# Altium footprint library Pin Header WR-PHD_2.54mm.PcbLib: 138 footprints (part 3 of 9)
Each footprint in its own frame and in the unit in brackets; x right, y up, seen from the top. Pads: shape width x height; smd on the part's side, far side on the other; paste and mask are expansions set on the pad; w line width, h text height; cw(c..) or ccw(c..) is an arc to the next point about the centre after c.
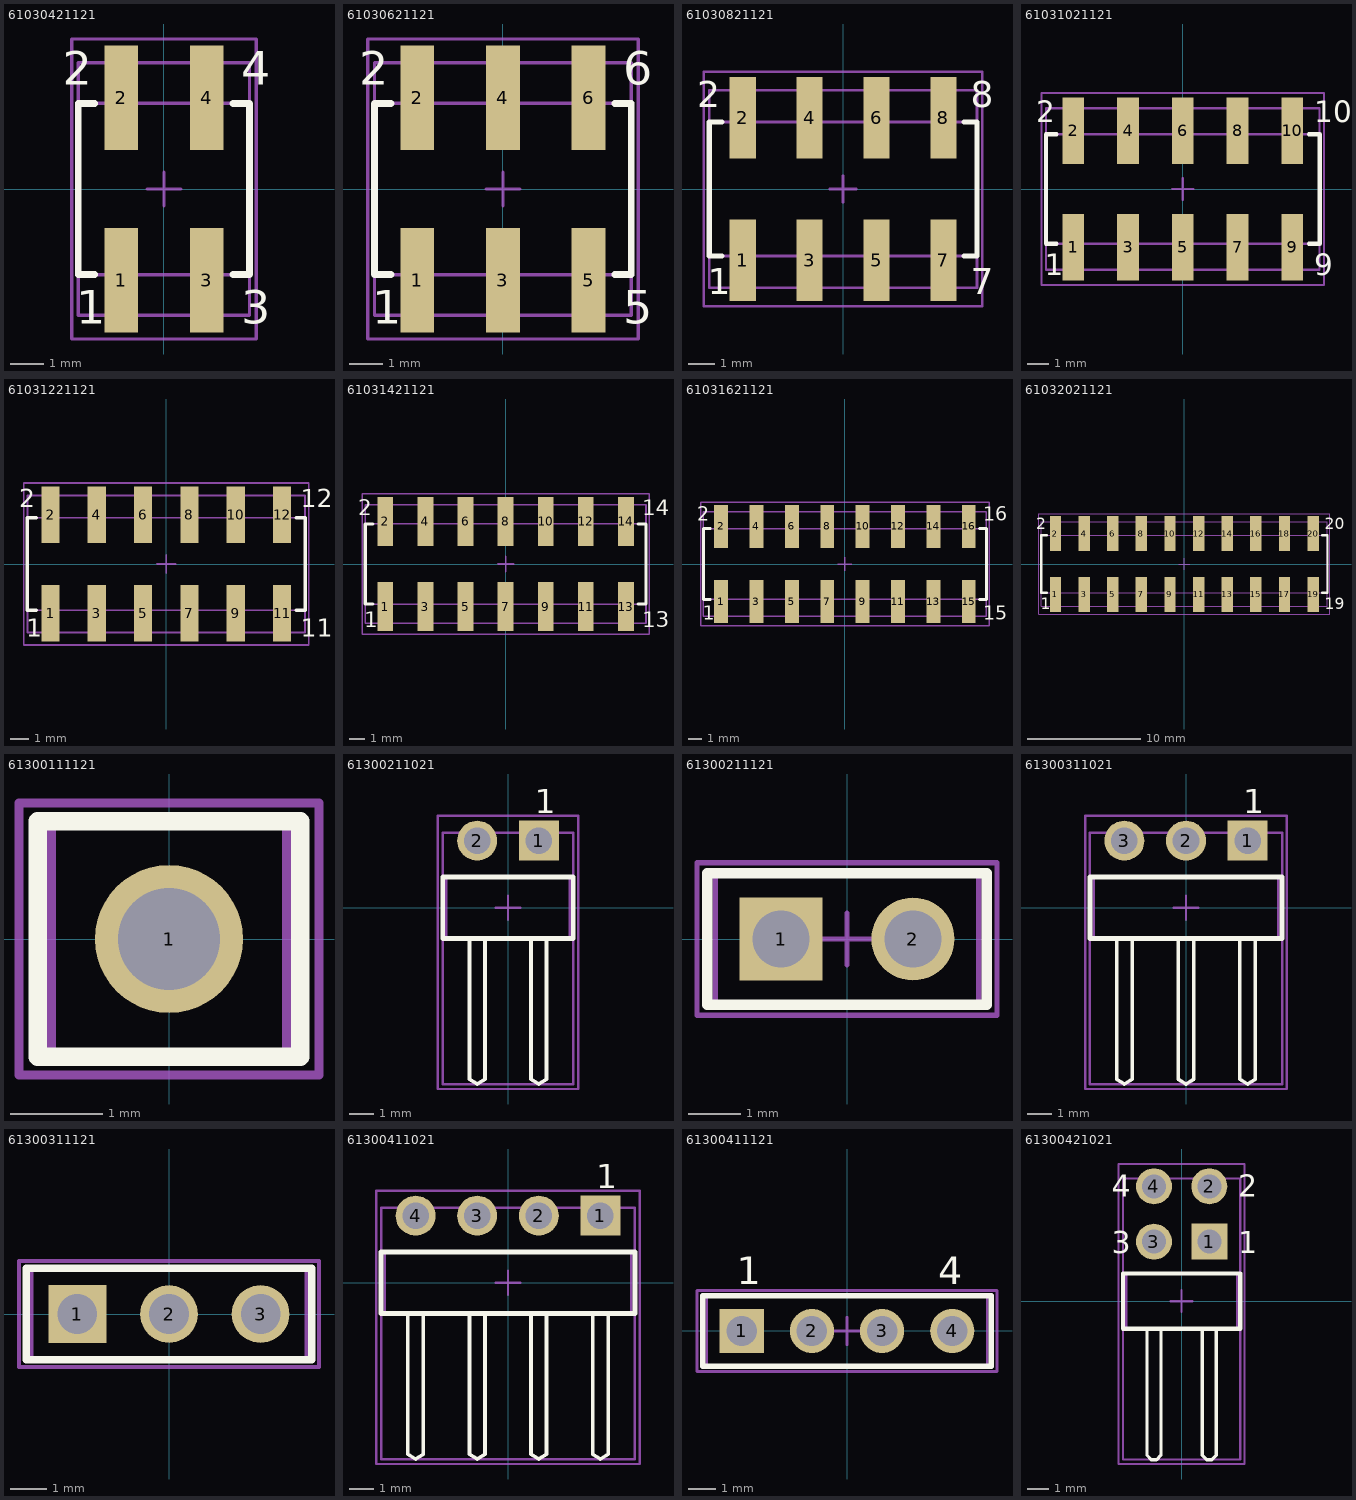
[diagram p2: the footprints below, top view; thin cyan lines are the x and y axes]

## 61030421121 [mm] "Pin Header, pitch 2.54 mm, SMD, Vertical, dual row, 4p"
height 9.6
pads (4):
  rect 1x3.1 smd: 1(-1.27,-2.7) 2(-1.27,2.7) 3(1.27,-2.7) 4(1.27,2.7)
Top Overlay:
  lines w0.2: -2.05,-2.54 -2.54,-2.54 -2.54,2.54 -2.05,2.54 ; 2.05,-2.54 2.54,-2.54 2.54,2.54 2.05,2.54
  text "2" at -3,3.1 h1
  text "4" at 2.3,3.1 h1
  text "3" at 2.3,-4 h1
  text "1" at -2.6,-4 h1
Mechanical 11:
  lines w0.1: -2.54,-2.54 -2.54,2.54 2.54,2.54 2.54,-2.54 -2.54,-2.54
Mechanical 13:
  lines w0.1: -2.54,-3.75 2.54,-3.75 2.54,3.75 -2.54,3.75 -2.54,-3.75
Mechanical 15:
  lines w0.1: -0.5,0 0.5,0 ; 0,-0.5 0,0.5 ; -2.74,-4.45 2.74,-4.45 2.74,4.45 -2.74,4.45 -2.74,-4.45
3D body "61030421121.stp": height 9.62, standoff 0.02, extent -2.54,-3.75 2.54,3.75

## 61030621121 [mm] "Pin Header, pitch 2.54 mm, SMD, Vertical, dual row, 6p"
height 9.6
pads (6):
  rect 1x3.1 smd: 1(-2.54,-2.7) 2(-2.54,2.7) 3(0,-2.7) 4(0,2.7) 5(2.54,-2.7) 6(2.54,2.7)
Top Overlay:
  lines w0.2: -3.32,-2.54 -3.81,-2.54 -3.81,2.54 -3.32,2.54 ; 3.32,-2.54 3.81,-2.54 3.81,2.54 3.32,2.54
  text "6" at 3.57,3.1 h1
  text "5" at 3.57,-4 h1
  text "1" at -3.87,-4 h1
  text "2" at -4.27,3.1 h1
Mechanical 11:
  lines w0.1: -3.81,-2.54 3.81,-2.54 3.81,2.54 -3.81,2.54 -3.81,-2.54
Mechanical 13:
  lines w0.1: -3.81,-3.75 -3.81,3.75 3.81,3.75 3.81,-3.75 -3.81,-3.75
Mechanical 15:
  lines w0.1: -0.5,0 0.5,0 ; 0,-0.5 0,0.5 ; -4.01,-4.45 -4.01,4.45 4.01,4.45 4.01,-4.45 -4.01,-4.45
3D body "61030621121.stp": height 9.62, standoff 0.02, extent -3.81,-3.75 3.81,3.75

## 61030821121 [mm] "Pin Header, pitch 2.54 mm, SMD, Vertical, dual row, 8p"
height 9.6
pads (8):
  rect 1x3.1 smd: 1(-3.81,-2.7) 2(-3.81,2.7) 3(-1.27,-2.7) 4(-1.27,2.7) 5(1.27,-2.7) 6(1.27,2.7) 7(3.81,-2.7) 8(3.81,2.7)
Top Overlay:
  lines w0.2: -4.59,-2.54 -5.08,-2.54 -5.08,2.54 -4.59,2.54 ; 4.59,-2.54 5.08,-2.54 5.08,2.54 4.59,2.54
  text "8" at 4.84,3.1 h1
  text "7" at 4.84,-4 h1
  text "1" at -5.14,-4 h1
  text "2" at -5.54,3.1 h1
Mechanical 11:
  lines w0.1: -5.08,-2.54 5.08,-2.54 5.08,2.54 -5.08,2.54 -5.08,-2.54
Mechanical 13:
  lines w0.1: -5.08,-3.75 -5.08,3.75 5.08,3.75 5.08,-3.75 -5.08,-3.75
Mechanical 15:
  lines w0.1: -0.5,0 0.5,0 ; 0,-0.5 0,0.5 ; -5.28,-4.45 -5.28,4.45 5.28,4.45 5.28,-4.45 -5.28,-4.45
3D body "61030821121.stp": height 9.62, standoff 0.02, extent -5.08,-3.75 5.08,3.75

## 61031021121 [mm] "Pin Header, pitch 2.54 mm, SMD, Vertical, dual row, 10p"
height 9.6
pads (10):
  rect 1x3.1 smd: 1(-5.08,-2.7) 2(-5.08,2.7) 3(-2.54,-2.7) 4(-2.54,2.7) 5(0,-2.7) 6(0,2.7) 7(2.54,-2.7) 8(2.54,2.7) 9(5.08,-2.7) 10(5.08,2.7)
Top Overlay:
  lines w0.2: -5.86,-2.54 -6.35,-2.54 -6.35,2.54 -5.86,2.54 ; 5.86,-2.54 6.35,-2.54 6.35,2.54 5.86,2.54
  text "10" at 6.11,3.1 h1
  text "9" at 6.11,-4 h1
  text "1" at -6.41,-4 h1
  text "2" at -6.81,3.1 h1
Mechanical 11:
  lines w0.1: -6.35,-2.54 6.35,-2.54 6.35,2.54 -6.35,2.54 -6.35,-2.54
Mechanical 13:
  lines w0.1: -6.35,-3.75 -6.35,3.75 6.35,3.75 6.35,-3.75 -6.35,-3.75
Mechanical 15:
  lines w0.1: -0.5,0 0.5,0 ; 0,-0.5 0,0.5 ; -6.55,-4.45 -6.55,4.45 6.55,4.45 6.55,-4.45 -6.55,-4.45
3D body "61031021121.stp": height 9.62, standoff 0.02, extent -6.35,-3.75 6.35,3.75

## 61031221121 [mm] "Pin Header, pitch 2.54 mm, SMD, Vertical, dual row, 12p"
height 9.6
pads (12):
  rect 1x3.1 smd: 1(-6.35,-2.7) 2(-6.35,2.7) 3(-3.81,-2.7) 4(-3.81,2.7) 5(-1.27,-2.7) 6(-1.27,2.7) 7(1.27,-2.7) 8(1.27,2.7) 9(3.81,-2.7) 10(3.81,2.7) 11(6.35,-2.7) 12(6.35,2.7)
Top Overlay:
  lines w0.2: -7.13,-2.54 -7.62,-2.54 -7.62,2.54 -7.13,2.54 ; 7.13,-2.54 7.62,-2.54 7.62,2.54 7.13,2.54
  text "12" at 7.38,3.1 h1
  text "11" at 7.38,-4 h1
  text "1" at -7.68,-4 h1
  text "2" at -8.08,3.1 h1
Mechanical 11:
  lines w0.1: -7.62,-2.54 7.62,-2.54 7.62,2.54 -7.62,2.54 -7.62,-2.54
Mechanical 13:
  lines w0.1: -7.62,-3.75 -7.62,3.75 7.62,3.75 7.62,-3.75 -7.62,-3.75
Mechanical 15:
  lines w0.1: -0.5,0 0.5,0 ; 0,-0.5 0,0.5 ; -7.82,-4.45 -7.82,4.45 7.82,4.45 7.82,-4.45 -7.82,-4.45
3D body "61031221121.stp": height 9.62, standoff 0.02, extent -7.62,-3.75 7.62,3.75

## 61031421121 [mm] "Pin Header, pitch 2.54 mm, SMD, Vertical, dual row, 14p"
height 9.6
pads (14):
  rect 1x3.1 smd: 1(-7.62,-2.7) 2(-7.62,2.7) 3(-5.08,-2.7) 4(-5.08,2.7) 5(-2.54,-2.7) 6(-2.54,2.7) 7(0,-2.7) 8(0,2.7) 9(2.54,-2.7) 10(2.54,2.7) 11(5.08,-2.7) 12(5.08,2.7) 13(7.62,-2.7) 14(7.62,2.7)
Top Overlay:
  lines w0.2: -8.4,-2.54 -8.89,-2.54 -8.89,2.54 -8.4,2.54 ; 8.4,-2.54 8.89,-2.54 8.89,2.54 8.4,2.54
  text "14" at 8.65,3.1 h1
  text "13" at 8.65,-4 h1
  text "1" at -8.95,-4 h1
  text "2" at -9.35,3.1 h1
Mechanical 11:
  lines w0.1: -8.89,-2.54 8.89,-2.54 8.89,2.54 -8.89,2.54 -8.89,-2.54
Mechanical 13:
  lines w0.1: -8.89,-3.75 -8.89,3.75 8.89,3.75 8.89,-3.75 -8.89,-3.75
Mechanical 15:
  lines w0.1: -0.5,0 0.5,0 ; 0,-0.5 0,0.5 ; -9.09,-4.45 -9.09,4.45 9.09,4.45 9.09,-4.45 -9.09,-4.45
3D body "61031421121.stp": height 9.62, standoff 0.02, extent -8.89,-3.75 8.89,3.75

## 61031621121 [mm] "Pin Header, pitch 2.54 mm, SMD, Vertical, dual row, 16p"
height 9.6
pads (16):
  rect 1x3.1 smd: 1(-8.89,-2.7) 2(-8.89,2.7) 3(-6.35,-2.7) 4(-6.35,2.7) 5(-3.81,-2.7) 6(-3.81,2.7) 7(-1.27,-2.7) 8(-1.27,2.7) 9(1.27,-2.7) 10(1.27,2.7) 11(3.81,-2.7) 12(3.81,2.7) 13(6.35,-2.7) 14(6.35,2.7) 15(8.89,-2.7) 16(8.89,2.7)
Top Overlay:
  lines w0.2: -9.67,-2.54 -10.16,-2.54 -10.16,2.54 -9.67,2.54 ; 9.67,-2.54 10.16,-2.54 10.16,2.54 9.67,2.54
  text "16" at 9.92,3.1 h1
  text "15" at 9.92,-4 h1
  text "1" at -10.22,-4 h1
  text "2" at -10.62,3.1 h1
Mechanical 11:
  lines w0.1: -10.16,-2.54 10.16,-2.54 10.16,2.54 -10.16,2.54 -10.16,-2.54
Mechanical 13:
  lines w0.1: -10.16,-3.75 -10.16,3.75 10.16,3.75 10.16,-3.75 -10.16,-3.75
Mechanical 15:
  lines w0.1: -0.5,0 0.5,0 ; 0,-0.5 0,0.5 ; -10.36,-4.45 -10.36,4.45 10.36,4.45 10.36,-4.45 -10.36,-4.45
3D body "61031621121.stp": height 9.62, standoff 0.02, extent -10.16,-3.75 10.16,3.75

## 61032021121 [mm] "Pin Header, pitch 2.54 mm, SMD, Vertical, dual row, 20p"
height 9.6
pads (20):
  rect 1x3.1 smd: 1(-11.43,-2.7) 2(-11.43,2.7) 3(-8.89,-2.7) 4(-8.89,2.7) 5(-6.35,-2.7) 6(-6.35,2.7) 7(-3.81,-2.7) 8(-3.81,2.7) 9(-1.27,-2.7) 10(-1.27,2.7) 11(1.27,-2.7) 12(1.27,2.7) 13(3.81,-2.7) 14(3.81,2.7) 15(6.35,-2.7) 16(6.35,2.7) 17(8.89,-2.7) 18(8.89,2.7) 19(11.43,-2.7) 20(11.43,2.7)
Top Overlay:
  lines w0.2: -12.21,-2.54 -12.7,-2.54 -12.7,2.54 -12.21,2.54 ; 12.21,-2.54 12.7,-2.54 12.7,2.54 12.21,2.54
  text "20" at 12.46,3.1 h1
  text "19" at 12.46,-4 h1
  text "1" at -12.76,-4 h1
  text "2" at -13.16,3.1 h1
Mechanical 11:
  lines w0.1: -12.7,-2.54 12.7,-2.54 12.7,2.54 -12.7,2.54 -12.7,-2.54
Mechanical 13:
  lines w0.1: -12.7,-3.75 -12.7,3.75 12.7,3.75 12.7,-3.75 -12.7,-3.75
Mechanical 15:
  lines w0.1: -0.5,0 0.5,0 ; 0,-0.5 0,0.5 ; -12.9,-4.45 -12.9,4.45 12.9,4.45 12.9,-4.45 -12.9,-4.45
3D body "61032021121.stp": height 9.62, standoff 0.02, extent -12.7,-3.75 12.7,3.75

## 61300111121 [mm] "Pin Header, pitch 2.54 mm, THT, Vertical, single row, 1p"
height 8.54
pads (1):
  round 1.6 hole 1.1: 1(0,0)
Top Overlay:
  lines w0.2: -1.42,-1.27 1.42,-1.27 1.42,1.27 -1.42,1.27 -1.42,-1.27
Mechanical 11:
  lines w0.1: -1.27,-1.27 1.27,-1.27 1.27,1.27 -1.27,1.27 -1.27,-1.27
Mechanical 13:
  lines w0.1: -1.42,-1.27 1.42,-1.27 1.42,1.27 -1.42,1.27 -1.42,-1.27
Mechanical 15:
  lines w0.1: -0.5,0 0.5,0 ; 0,-0.5 0,0.5 ; -1.62,-1.47 1.62,-1.47 1.62,1.47 -1.62,1.47 -1.62,-1.47
3D body "61300111121.stp": height 8.57, standoff -2.97, extent -1.27,-1.27 1.27,1.27

## 61300211021 [mm] "Pin Header, pitch 2.54 mm, THT, Angled, single row, 2p"
height 2.54
pads (2):
  rect 1.65x1.65 hole 1.1: 1(1.27,2.77)
  round 1.65 hole 1.1: 2(-1.27,2.77)
Top Overlay:
  lines w0.15: -1.59,-1.27 -1.59,-7.07 -1.27,-7.27 -0.95,-7.07 -0.95,-1.27 ; 0.95,-1.27 0.95,-7.07 1.27,-7.27 1.59,-7.07 1.59,-1.27
  lines w0.2: -2.69,-1.27 -2.69,1.27 2.69,1.27 2.69,-1.27 -2.69,-1.27
  text "1" at 1.1,3.9 h1
Mechanical 11:
  lines w0.1: -2.54,-1.27 -2.54,1.27 2.54,1.27 2.54,-1.27 -2.54,-1.27
Mechanical 13:
  lines w0.1: -2.69,-7.27 2.69,-7.27 2.69,3.09 -2.69,3.09 -2.69,-7.27
Mechanical 15:
  lines w0.1: -0.5,0 0.5,0 ; 0,-0.5 0,0.5 ; -2.89,-7.47 2.89,-7.47 2.89,3.795 -2.89,3.795 -2.89,-7.47
3D body "61300211021.stp": height 2.62, standoff -2.92, extent -2.54,-7.27 2.54,3.09

## 61300211121 [mm] "Pin Header, pitch 2.54 mm, THT, Vertical, single row, 2p"
height 8.54
pads (2):
  rect 1.6x1.6 hole 1.1: 1(-1.27,0)
  round 1.6 hole 1.1: 2(1.27,0)
Top Overlay:
  lines w0.2: -2.69,-1.27 -2.69,1.27 2.69,1.27 2.69,-1.27 -2.69,-1.27
Mechanical 11:
  lines w0.1: -2.54,-1.27 -2.54,1.27 2.54,1.27 2.54,-1.27 -2.54,-1.27
Mechanical 13:
  lines w0.1: -2.69,-1.27 -2.69,1.27 2.69,1.27 2.69,-1.27 -2.69,-1.27
Mechanical 15:
  lines w0.1: -0.5,0 0.5,0 ; 0,-0.5 0,0.5 ; -2.89,-1.47 -2.89,1.47 2.89,1.47 2.89,-1.47 -2.89,-1.47
3D body "61300211121.stp": height 8.57, standoff -2.97, extent -2.54,-1.27 2.54,1.27

## 61300311021 [mm] "Pin Header, pitch 2.54 mm, THT, Angled, single row, 3p"
height 2.54
pads (3):
  rect 1.65x1.65 hole 1.1: 1(2.54,2.77)
  round 1.65 hole 1.1: 2(0,2.77) 3(-2.54,2.77)
Top Overlay:
  lines w0.15: -2.86,-1.27 -2.86,-7.07 -2.54,-7.27 -2.22,-7.07 -2.22,-1.27 ; -0.32,-1.27 -0.32,-7.07 0,-7.27 0.32,-7.07 0.32,-1.27 ; 2.22,-1.27 2.22,-7.07 2.54,-7.27 2.86,-7.07 2.86,-1.27
  lines w0.2: -3.96,-1.27 -3.96,1.27 3.96,1.27 3.96,-1.27 -3.96,-1.27
  text "1" at 2.37,3.9 h1
Mechanical 11:
  lines w0.1: -3.81,-1.27 -3.81,1.27 3.81,1.27 3.81,-1.27 -3.81,-1.27
Mechanical 13:
  lines w0.1: -3.96,-7.27 3.96,-7.27 3.96,3.09 -3.96,3.09 -3.96,-7.27
Mechanical 15:
  lines w0.1: -0.5,0 0.5,0 ; 0,-0.5 0,0.5 ; -4.16,-7.47 4.16,-7.47 4.16,3.795 -4.16,3.795 -4.16,-7.47
3D body "61300311021.stp": height 2.62, standoff -2.92, extent -3.81,-7.27 3.81,3.09

## 61300311121 [mm] "Pin Header, pitch 2.54 mm, THT, Vertical, single row, 3p"
height 8.54
pads (3):
  rect 1.6x1.6 hole 1.1: 1(-2.54,0)
  round 1.6 hole 1.1: 2(0,0) 3(2.54,0)
Top Overlay:
  lines w0.2: -3.96,-1.27 -3.96,1.27 3.96,1.27 3.96,-1.27 -3.96,-1.27
Mechanical 11:
  lines w0.1: -3.81,-1.27 3.81,-1.27 3.81,1.27 -3.81,1.27 -3.81,-1.27
Mechanical 13:
  lines w0.1: -3.96,-1.27 -3.96,1.27 3.96,1.27 3.96,-1.27 -3.96,-1.27
Mechanical 15:
  lines w0.1: -0.5,0 0.5,0 ; 0,-0.5 0,0.5 ; -4.16,-1.47 -4.16,1.47 4.16,1.47 4.16,-1.47 -4.16,-1.47
3D body "61300311121.stp": height 8.57, standoff -2.97, extent -3.81,-1.27 3.81,1.27

## 61300411021 [mm] "Pin Header, pitch 2.54 mm, THT, Angled, single row, 4p"
height 2.54
pads (4):
  rect 1.65x1.65 hole 1.1: 1(3.81,2.77)
  round 1.65 hole 1.1: 2(1.27,2.77) 3(-1.27,2.77) 4(-3.81,2.77)
Top Overlay:
  lines w0.15: -4.13,-1.27 -4.13,-7.07 -3.81,-7.27 -3.49,-7.07 -3.49,-1.27 ; -1.59,-1.27 -1.59,-7.07 -1.27,-7.27 -0.95,-7.07 -0.95,-1.27 ; 0.95,-1.27 0.95,-7.07 1.27,-7.27 1.59,-7.07 1.59,-1.27 ; 3.49,-1.27 3.49,-7.07 3.81,-7.27 4.13,-7.07 4.13,-1.27
  lines w0.2: -5.23,-1.27 -5.23,1.27 5.23,1.27 5.23,-1.27 -5.23,-1.27
  text "1" at 3.64,3.9 h1
Mechanical 11:
  lines w0.1: -5.08,-1.27 -5.08,1.27 5.08,1.27 5.08,-1.27 -5.08,-1.27
Mechanical 13:
  lines w0.1: -5.23,-7.27 -5.23,3.09 5.23,3.09 5.23,-7.27 -5.23,-7.27
Mechanical 15:
  lines w0.1: -0.5,0 0.5,0 ; 0,-0.5 0,0.5 ; -5.43,-7.47 5.43,-7.47 5.43,3.795 -5.43,3.795 -5.43,-7.47
3D body "61300411021.stp": height 2.62, standoff -2.92, extent -5.08,-7.27 5.08,3.09

## 61300411121 [mm] "Pin Header, pitch 2.54 mm, THT, Vertical, single row, 4p"
height 8.54
pads (4):
  rect 1.6x1.6 hole 1.1: 1(-3.81,0)
  round 1.6 hole 1.1: 2(-1.27,0) 3(1.27,0) 4(3.81,0)
Top Overlay:
  lines w0.2: -5.23,-1.27 -5.23,1.27 5.23,1.27 5.23,-1.27 -5.23,-1.27
  text "1" at -4,1.7 h1
  text "4" at 3.3,1.7 h1
Mechanical 11:
  lines w0.1: -5.08,-1.27 5.08,-1.27 5.08,1.27 -5.08,1.27 -5.08,-1.27
Mechanical 13:
  lines w0.1: -5.23,-1.27 -5.23,1.27 5.23,1.27 5.23,-1.27 -5.23,-1.27
Mechanical 15:
  lines w0.1: -0.5,0 0.5,0 ; 0,-0.5 0,0.5 ; -5.43,-1.47 -5.43,1.47 5.43,1.47 5.43,-1.47 -5.43,-1.47
3D body "61300411121.stp": height 8.57, standoff -2.97, extent -5.08,-1.27 5.08,1.27

## 61300421021 [mm] "Pin Header, pitch 2.54 mm, THT, Angled, dual row, 4p"
height 5.08
pads (4):
  rect 1.65x1.65 hole 1.1: 1(1.27,2.73)
  round 1.65 hole 1.1: 2(1.27,5.27) 3(-1.27,2.73) 4(-1.27,5.27)
Top Overlay:
  lines w0.15: -1.59,-1.335 -1.59,-7.07 -1.39,-7.27 -1.15,-7.27 -0.95,-7.07 -0.95,-1.31 ; 0.95,-1.335 0.95,-7.07 1.15,-7.27 1.39,-7.27 1.59,-7.07 1.59,-1.31
  lines w0.2: -2.69,-1.27 -2.69,1.27 2.69,1.27 2.69,-1.27 -2.69,-1.27
  text "1" at 2.6,2.2 h1
  text "2" at 2.6,4.8 h1
  text "4" at -3.2,4.8 h1
  text "3" at -3.2,2.2 h1
Mechanical 11:
  lines w0.1: -2.54,-1.27 -2.54,1.27 2.54,1.27 2.54,-1.27 -2.54,-1.27
Mechanical 13:
  lines w0.1: -2.69,-7.27 2.69,-7.27 2.69,5.63 -2.69,5.63 -2.69,-7.27
Mechanical 15:
  lines w0.1: -0.5,0 0.5,0 ; 0,-0.5 0,0.5 ; -2.89,-7.47 2.89,-7.47 2.89,6.295 -2.89,6.295 -2.89,-7.47
3D body "61300421021.stp": height 5.14, standoff -2.94, extent -2.54,-7.27 2.54,5.63